# Altium footprint library Relays.PcbLib: 113 footprints (part 8 of 8)
Each footprint in its own frame and in the unit in brackets; x right, y up, seen from the top. Pads: shape width x height; smd on the part's side, far side on the other; paste and mask are expansions set on the pad; w line width, h text height; cw(c..) or ccw(c..) is an arc to the next point about the centre after c.
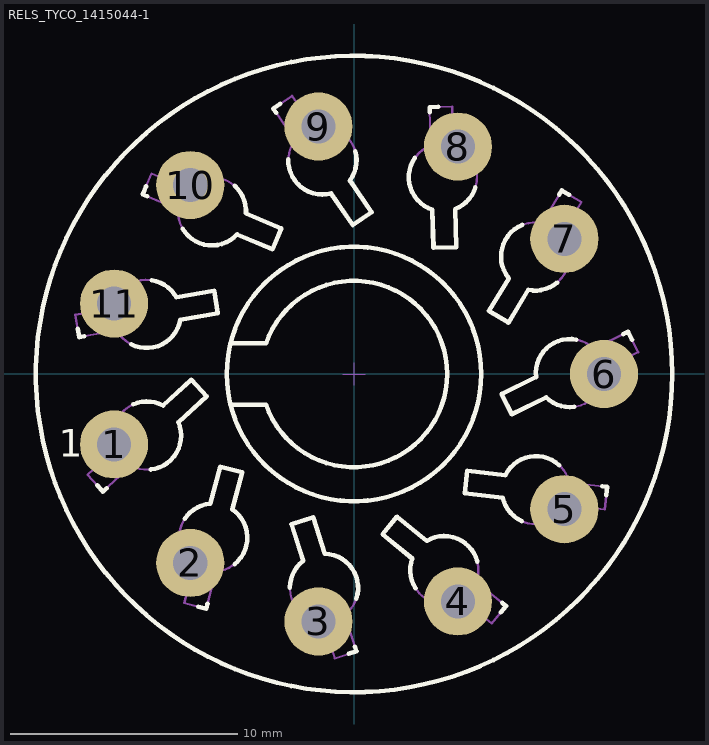
[diagram p7: the footprint, top view; thin cyan lines are the x and y axes]

## RELS_TYCO_1415044-1 [mm] "Through Hole Round Socket for Relay 11 Pins, MT78603"
height 15.2
pads (11):
  round 3 hole 1.5: 1(-10.554,-3.099) 2(-7.203,-8.313) 3(-1.565,-10.888) 4(4.57,-10.006) 5(9.254,-5.947) 6(11,0) 7(9.254,5.947) 8(4.57,10.006) 9(-1.565,10.888) 10(-7.203,8.313) 11(-10.554,3.099)
Top Overlay:
  circle w0.2: c0,0 r5.6
  circle w0.2: c0,0 r14
  lines w0.2: -12.159,1.991 -12.095,1.623 -11.872,1.662 ; -11.304,-4.899 -11.054,-5.173 -10.888,-5.02 ; -9.799,1.301 ccw(c-9.125,2.642) -7.647,2.389 -5.985,2.675 -6.155,3.661 -7.816,3.374 ccw(c-9.125,2.642) -8.896,4.124 ; -9.715,-1.339 cw(c-9.105,-2.71) -8.4,-1.386 -7.157,-0.247 -6.482,-0.985 -7.725,-2.123 cw(c-9.105,-2.71) -8.946,-4.201 ; -9.152,8.249 -9.299,7.903 -9.089,7.814 ; -7.541,6.393 ccw(c-6.249,7.155) -5.142,6.143 -3.59,5.486 -3.2,6.407 -4.752,7.064 ccw(c-6.249,7.155) -5.254,8.277 ; -7.45,-6.379 cw(c-6.196,-7.202) -6.318,-5.707 -5.888,-4.077 -4.921,-4.332 -5.351,-5.962 cw(c-6.196,-7.202) -5.254,-8.369 ; -6.859,-10.233 -6.504,-10.327 -6.447,-10.11 ; -5.435,-1.35 -3.871,-1.35 ccw(c0,0) -3.871,1.35 -5.435,1.35 ; -3.422,11.486 -3.551,11.676 -3.239,11.889 ; -2.889,9.456 ccw(c-1.39,9.398) -1.005,7.948 -0.055,6.556 0.771,7.12 -0.18,8.512 ccw(c-1.39,9.398) 0.054,9.802 ; -2.82,-9.395 cw(c-1.32,-9.408) -2.231,-8.216 -2.75,-6.612 -1.798,-6.305 -1.28,-7.908 cw(c-1.32,-9.408) 0.104,-9.88 ; -0.237,-12.316 0.11,-12.203 0.042,-11.992 ; 2.682,9.518 ccw(c3.91,8.658) 3.45,7.23 3.498,5.545 4.497,5.573 4.45,7.258 ccw(c3.91,8.658) 5.344,8.216 ; 2.707,-9.43 cw(c3.975,-8.629) 2.564,-8.118 1.261,-7.05 1.895,-6.276 3.198,-7.345 cw(c3.975,-8.629) 5.428,-8.255 ; 3.33,11.511 3.323,11.743 3.704,11.753 ; 6.459,-10.488 6.689,-10.208 6.519,-10.068 ; 7.375,-6.471 cw(c8.008,-5.111) 6.546,-5.444 4.871,-5.25 4.987,-4.256 6.661,-4.451 cw(c8.008,-5.111) 9.027,-4.01 ; 7.402,6.559 ccw(c7.97,5.17) 6.811,4.218 5.94,2.775 6.796,2.258 7.667,3.701 ccw(c7.97,5.17) 8.936,4.023 ; 9.023,7.883 9.143,8.083 9.472,7.885 ; 9.691,-1.446 cw(c9.5,0.042) 8.451,-1.03 6.938,-1.774 6.497,-0.876 8.01,-0.133 cw(c9.5,0.042) 9.774,1.517 ; 10.928,-4.947 11.145,-4.972 11.104,-5.33 ; 11.851,1.754 12.062,1.858 12.232,1.512
  text "1" at -12.985,-3.645 h1.2
Mechanical 8:
  circle w0.05: c9.254,-5.947 r0.75
  circle w0.05: c4.57,-10.006 r0.75
  circle w0.05: c-1.565,-10.888 r0.75
  circle w0.05: c-7.203,-8.313 r0.75
  circle w0.05: c-10.554,-3.099 r0.75
  circle w0.05: c-10.554,3.099 r0.75
  circle w0.05: c-7.203,8.313 r0.75
  circle w0.05: c-1.565,10.888 r0.75
  circle w0.05: c4.57,10.006 r0.75
  circle w0.05: c9.254,5.947 r0.75
  circle w0.05: c11,0 r0.75
  lines w0.05: -11.054,-3.099 -10.554,-3.099 ; -11.054,3.099 -10.554,3.099 ; -10.554,-3.599 -10.554,-3.099 ; -10.554,-2.599 -10.554,-3.099 ; -10.554,2.599 -10.554,3.099 ; -10.554,3.599 -10.554,3.099 ; -10.054,-3.099 -10.554,-3.099 ; -10.054,3.099 -10.554,3.099 ; -7.703,-8.313 -7.203,-8.313 ; -7.703,8.313 -7.203,8.313 ; -7.203,-8.813 -7.203,-8.313 ; -7.203,-7.813 -7.203,-8.313 ; -7.203,7.813 -7.203,8.313 ; -7.203,8.813 -7.203,8.313 ; -6.703,-8.313 -7.203,-8.313 ; -6.703,8.313 -7.203,8.313 ; -2.065,-10.888 -1.565,-10.888 ; -2.065,10.888 -1.565,10.888 ; -1.565,-11.388 -1.565,-10.888 ; -1.565,-10.388 -1.565,-10.888 ; -1.565,10.388 -1.565,10.888 ; -1.565,11.388 -1.565,10.888 ; -1.065,-10.888 -1.565,-10.888 ; -1.065,10.888 -1.565,10.888 ; -0.5,0 0,0 ; 0,-0.5 0,0 ; 0,0.5 0,0 ; 0.5,0 0,0 ; 4.07,-10.006 4.57,-10.006 ; 4.07,10.006 4.57,10.006 ; 4.57,-10.506 4.57,-10.006 ; 4.57,-9.506 4.57,-10.006 ; 4.57,9.506 4.57,10.006 ; 4.57,10.506 4.57,10.006 ; 5.07,-10.006 4.57,-10.006 ; 5.07,10.006 4.57,10.006 ; 8.754,-5.947 9.254,-5.947 ; 8.754,5.947 9.254,5.947 ; 9.254,-6.447 9.254,-5.947 ; 9.254,-5.447 9.254,-5.947 ; 9.254,5.447 9.254,5.947 ; 9.254,6.447 9.254,5.947 ; 9.754,-5.947 9.254,-5.947 ; 9.754,5.947 9.254,5.947 ; 10.5,0 11,0 ; 11,-0.5 11,0 ; 11,0.5 11,0 ; 11.5,0 11,0
Mechanical 14:
  circle w0.1: c0,0 r5.6
  circle w0.1: c0,0 r14
  lines w0.1: -5.435,-1.35 -3.871,-1.35 ccw(c0,0) -3.871,1.35 -5.435,1.35 ; -12.265,2.609 -10.604,2.895 cw(c-9.125,2.642) -7.816,3.374 -6.155,3.661 -5.985,2.675 -7.647,2.389 cw(c-9.125,2.642) -10.434,1.909 -12.095,1.623 -12.265,2.609 ; -11.729,-4.435 -10.486,-3.296 cw(c-9.105,-2.71) -8.4,-1.386 -7.157,-0.247 -6.482,-0.985 -7.725,-2.123 cw(c-9.105,-2.71) -9.81,-4.034 -11.054,-5.173 -11.729,-4.435 ; -9.299,7.903 -8.909,8.824 -7.357,8.167 cw(c-6.249,7.155) -4.752,7.064 -3.2,6.407 -3.59,5.486 -5.142,6.143 cw(c-6.249,7.155) -7.747,7.246 -9.299,7.903 ; -7.471,-10.071 -7.04,-8.441 cw(c-6.196,-7.202) -6.318,-5.707 -5.888,-4.077 -4.921,-4.332 -5.351,-5.962 cw(c-6.196,-7.202) -6.073,-8.697 -6.504,-10.327 -7.471,-10.071 ; -3.551,11.676 -2.725,12.24 -1.775,10.848 cw(c-1.39,9.398) -0.18,8.512 0.771,7.12 -0.055,6.556 -1.005,7.948 cw(c-1.39,9.398) -2.6,10.284 -3.551,11.676 ; -2.75,-6.612 -1.798,-6.305 -1.28,-7.908 cw(c-1.32,-9.408) -0.409,-10.6 0.11,-12.203 -0.841,-12.511 -1.36,-10.907 cw(c-1.32,-9.408) -2.231,-8.216 -2.75,-6.612 ; 1.261,-7.05 1.895,-6.276 3.198,-7.345 cw(c3.975,-8.629) 5.385,-9.139 6.689,-10.208 6.055,-10.981 4.751,-9.912 cw(c3.975,-8.629) 2.564,-8.118 1.261,-7.05 ; 3.323,11.743 4.323,11.771 4.37,10.086 cw(c3.91,8.658) 4.45,7.258 4.497,5.573 3.498,5.545 3.45,7.23 cw(c3.91,8.658) 3.371,10.057 3.323,11.743 ; 4.871,-5.25 4.987,-4.256 6.661,-4.451 cw(c8.008,-5.111) 9.471,-4.778 11.145,-4.972 11.03,-5.966 9.355,-5.771 cw(c8.008,-5.111) 6.546,-5.444 4.871,-5.25 ; 5.94,2.775 6.796,2.258 7.667,3.701 ccw(c7.97,5.17) 9.129,6.123 10,7.566 9.143,8.083 8.272,6.639 ccw(c7.97,5.17) 6.811,4.218 5.94,2.775 ; 6.497,-0.876 6.938,-1.774 8.451,-1.03 ccw(c9.5,0.042) 10.99,0.217 12.503,0.96 12.062,1.858 10.549,1.114 ccw(c9.5,0.042) 8.01,-0.133 6.497,-0.876
  text "1" at -12.985,-3.645 h1.2
3D body "RELS_TYCO_1415044-1.stp": height 15.15, standoff -3.35, extent -13.999,-13.999 13.999,13.998